# Altium footprint library SILICA_PCBLIB.PcbLib: 161 footprints (part 5 of 11)
Each footprint in its own frame and in the unit in brackets; x right, y up, seen from the top. Pads: shape width x height; smd on the part's side, far side on the other; paste and mask are expansions set on the pad; w line width, h text height; cw(c..) or ccw(c..) is an arc to the next point about the centre after c.
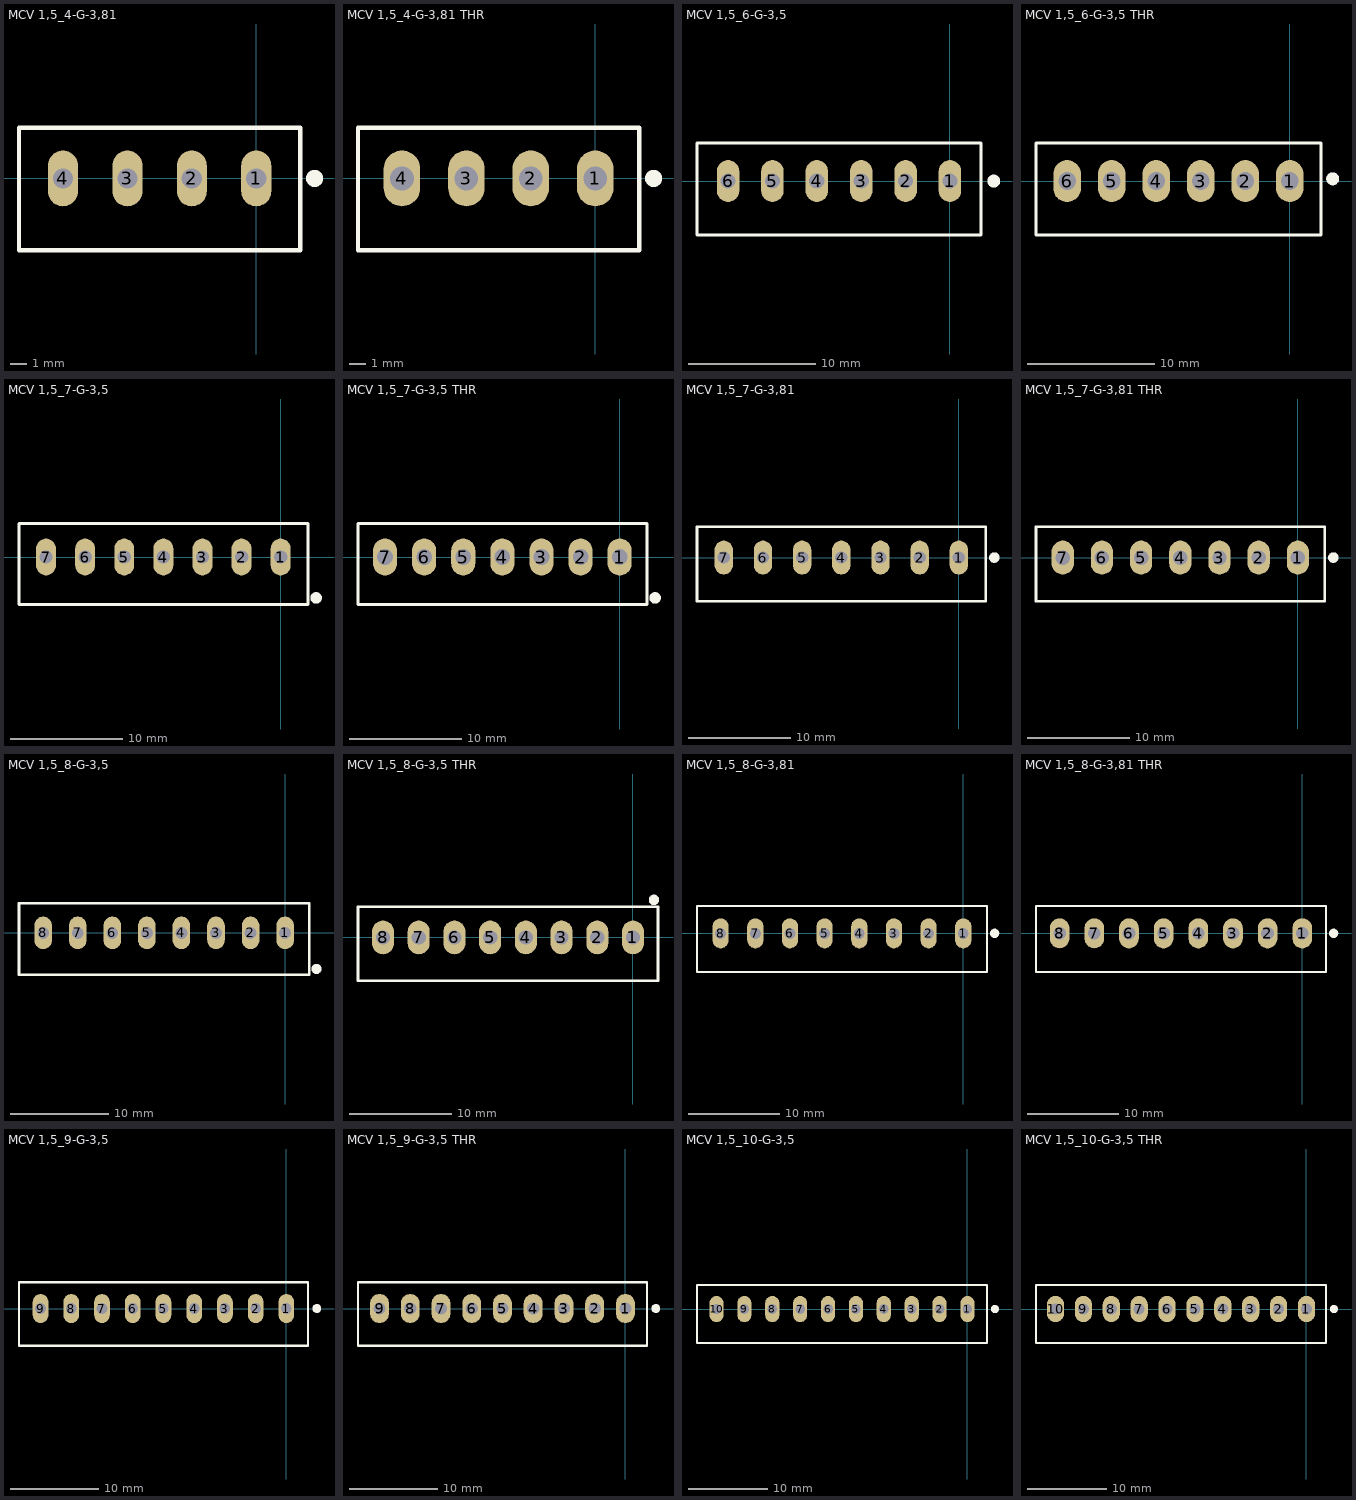
[diagram p4: the footprints below, top view; thin cyan lines are the x and y axes]

## MCV 1,5_4-G-3,81 [mil]
height 362.2
pads (4):
  rrect100% 70x130 hole 47.24: 1(0,0) 2(-150,0) 3(-300,0.01) 4(-449.99,0.01)
Top Overlay:
  circle w19.68: c135.83,0 r10.2
  lines w10: -552.36,-167.32 -552.36,118.11 102.36,118.11 102.36,-167.32 -552.36,-167.32
3D body "1707023.stp": height 362.2, standoff -55.12, extent -552.36,-167.32 102.36,118.11

## MCV 1,5_4-G-3,81 THR [mil]
height 362.2
pads (4):
  rrect100% 85x130 hole 55.12: 1(0,0) 2(-150,0) 3(-300,0.01) 4(-449.99,0.01)
Top Overlay:
  circle w19.68: c135.83,0 r10.2
  lines w10: -552.36,-167.32 -552.36,118.11 102.36,118.11 102.36,-167.32 -552.36,-167.32
3D body "1707023.stp": height 362.2, standoff -55.12, extent -552.36,-167.32 102.36,118.11

## MCV 1,5_6-G-3,5 [mil]
height 362.2
pads (6):
  oval 70x130 hole 47.24: 1(0,0) 2(-137.8,0) 3(-275.59,0) 4(-413.39,0) 5(-551.18,0) 6(-688.98,0)
Top Overlay:
  circle w19.68: c135.83,0 r10.2
  lines w10: -785.43,-167.32 96.46,-167.32 96.46,118.11 -785.43,118.11 -785.43,-167.32
3D body "1843648.stp": height 362.2, standoff -133.86, extent -785.43,-167.32 96.46,118.11

## MCV 1,5_6-G-3,5 THR [mil]
height 362.2
pads (6):
  oval 85x130 hole 55.12: 1(0,0) 2(-137.8,0) 3(-275.59,0) 4(-413.39,0) 5(-551.18,0) 6(-688.98,0)
Top Overlay:
  circle w19.68: c132.83,7 r10.2
  lines w10: -785.43,-167.32 -785.43,118.11 96.46,118.11 96.46,-167.32 -785.43,-167.32
3D body "1843648.stp": height 362.2, standoff -133.86, extent -785.43,-167.32 96.46,118.11

## MCV 1,5_7-G-3,5 [mil]
height 362.2
pads (7):
  rrect100% 70x130 hole 47.24: 1(-0.01,0.02) 2(-137.8,0.02) 3(-275.6,0.02) 4(-413.39,0.02) 5(-551.19,0.02) 6(-688.98,0.02) 7(-826.78,0.02)
Top Overlay:
  circle w19.68: c124.8,-144 r10.2
  lines w10: -922,-167.31 -922,118.13 ; -919,-167.31 96.45,-167.31 96.45,118.13 -919,118.13
3D body "1843651.stp": height 362.2, standoff -133.86, extent -923.24,-167.3 96.45,118.13

## MCV 1,5_7-G-3,5 THR [mil]
height 362.2
pads (7):
  rrect100% 85x130 hole 55.12: 1(-0.01,0.02) 2(-137.8,0.02) 3(-275.6,0.02) 4(-413.39,0.02) 5(-551.19,0.02) 6(-688.98,0.02) 7(-826.78,0.02)
Top Overlay:
  circle w19.68: c124.8,-144 r10.2
  lines w10: -922,-167.31 -922,118.13 ; -919,-167.31 96.45,-167.31 96.45,118.13 -919,118.13
3D body "1843651.stp": height 362.2, standoff -133.86, extent -923.24,-167.3 96.45,118.13

## MCV 1,5_7-G-3,81 [mil]
height 362.2
pads (7):
  oval 70x130 hole 47.24: 1(0,0) 2(-150,0) 3(-300,0) 4(-450,0) 5(-600,0) 6(-750,0.01) 7(-899.99,0.01)
Top Overlay:
  circle w19.68: c135.83,0 r10.2
  lines w10: -1002.36,-167.32 102.36,-167.32 102.36,118.11 -1002.36,118.11 -1002.36,-167.32
3D body "1707052.stp": height 362.2, standoff -55.12, extent -1002.36,-167.32 102.36,118.11

## MCV 1,5_7-G-3,81 THR [mil]
height 362.2
pads (7):
  oval 85x130 hole 55.12: 1(0,0) 2(-150,0) 3(-300,0) 4(-450,0) 5(-600,0) 6(-750,0.01) 7(-899.99,0.01)
Top Overlay:
  circle w19.68: c135.83,0 r10.2
  lines w10: -1002.36,-167.32 -1002.36,118.11 102.36,118.11 102.36,-167.32 -1002.36,-167.32
3D body "1707052.stp": height 362.2, standoff -55.12, extent -1002.36,-167.32 102.36,118.11

## MCV 1,5_8-G-3,5 [mil]
height 362.2
pads (8):
  rrect100% 70x130 hole 47.24: 1(-0.01,0.02) 2(-137.8,0.02) 3(-275.6,0.02) 4(-413.39,0.02) 5(-551.19,0.02) 6(-688.98,0.02) 7(-826.78,0.02)
  oval 70x130 hole 47.24: 8(-964.57,0.02)
Top Overlay:
  circle w19.68: c124.8,-144 r10.2
  lines w10: -1061.03,-167.31 96.45,-167.31 96.45,118.13 -1061.03,118.13 -1061.03,-167.31
3D body "1843664.stp": height 362.2, standoff -133.86, extent -1061.03,-167.31 96.45,118.13

## MCV 1,5_8-G-3,5 THR [mil]
height 362.2
pads (8):
  rrect100% 85x130 hole 55.12: 1(0.01,0) 2(-137.79,0) 3(-275.58,0) 4(-413.38,0) 5(-551.17,0) 6(-688.97,0) 7(-826.76,0)
  oval 85x130 hole 55.12: 8(-964.56,0)
Top Overlay:
  circle w19.68: c80.81,145 r10.2
  lines w10: -1061.02,-167.32 -1061.02,118.11 96.46,118.11 96.46,-167.32 -1061.02,-167.32
3D body "1843664.stp": height 362.2, standoff -133.86, extent -1061.02,-167.32 96.47,118.11

## MCV 1,5_8-G-3,81 [mil]
height 362.2
pads (8):
  oval 70x130 hole 47.24: 1(0,0) 2(-150,0) 3(-300,0) 4(-450,0) 5(-600,0) 6(-750,0) 7(-900,0.01) 8(-1049.99,0.01)
Top Overlay:
  circle w19.68: c135.83,0 r10.2
  lines w10: -1152.36,-167.32 -1152.36,118.11 102.36,118.11 102.36,-167.32 -1152.36,-167.32
3D body "1803484.stp": height 362.2, standoff -133.86, extent -1152.36,-167.32 102.36,118.11

## MCV 1,5_8-G-3,81 THR [mil]
height 362.2
pads (8):
  oval 85x130 hole 55.12: 1(0,0) 2(-150,0) 3(-300,0) 4(-450,0) 5(-600,0) 6(-750,0) 7(-900,0.01) 8(-1049.99,0.01)
Top Overlay:
  circle w19.68: c135.83,0 r10.2
  lines w10: -1152.36,-167.32 -1152.36,118.11 102.36,118.11 102.36,-167.32 -1152.36,-167.32
3D body "1707065.stp": height 362.2, standoff -55.12, extent -1152.36,-167.32 102.36,118.11

## MCV 1,5_9-G-3,5 [mil]
height 362.2
pads (9):
  oval 70x130 hole 47.24: 1(0,0) 2(-137.8,0) 3(-275.59,0) 4(-413.39,0) 5(-551.18,0) 6(-688.98,0) 7(-826.77,0) 8(-964.57,0) 9(-1102.36,0)
Top Overlay:
  circle w19.68: c135.83,0 r10.2
  lines w10: -1198.82,-167.32 -1198.82,118.11 96.46,118.11 96.46,-167.32 -1198.82,-167.32
3D body "1843677.stp": height 362.2, standoff -133.86, extent -1198.82,-167.32 96.46,118.11

## MCV 1,5_9-G-3,5 THR [mil]
height 362.2
pads (9):
  oval 85x130 hole 55.12: 1(0,0) 2(-137.8,0) 3(-275.59,0) 4(-413.39,0) 5(-551.18,0) 6(-688.98,0) 7(-826.77,0) 8(-964.57,0) 9(-1102.36,0)
Top Overlay:
  circle w19.68: c135.83,0 r10.2
  lines w10: -1198.82,-167.32 -1198.82,118.11 96.46,118.11 96.46,-167.32 -1198.82,-167.32
3D body "1843677.stp": height 362.2, standoff -133.86, extent -1198.82,-167.32 96.46,118.11

## MCV 1,5_10-G-3,5 [mil]
height 362.2
pads (10):
  oval 70x130 hole 47.24: 1(0,0) 2(-137.8,0) 3(-275.59,0) 4(-413.39,0) 5(-551.18,0) 6(-688.98,0) 7(-826.77,0) 8(-964.57,0) 9(-1102.36,0) 10(-1240.16,0)
Top Overlay:
  circle w19.68: c135.83,0 r10.2
  lines w10: -1336.61,-167.32 96.46,-167.32 96.46,118.11 -1336.61,118.11 -1336.61,-167.32
3D body "1843680.stp": height 362.2, standoff -133.86, extent -1336.61,-167.32 96.46,118.11

## MCV 1,5_10-G-3,5 THR [mil]
height 362.2
pads (10):
  oval 85x130 hole 55.12: 1(0,0) 2(-137.8,0) 3(-275.59,0) 4(-413.39,0) 5(-551.18,0) 6(-688.98,0) 7(-826.77,0) 8(-964.57,0) 9(-1102.36,0) 10(-1240.16,0)
Top Overlay:
  circle w19.68: c135.83,0 r10.2
  lines w10: -1336.61,-167.32 96.46,-167.32 96.46,118.11 -1336.61,118.11 -1336.61,-167.32
3D body "1843680.stp": height 362.2, standoff -133.86, extent -1336.61,-167.32 96.46,118.11